# Altium footprint library 共模电感.PcbLib: 8 footprints
Each footprint in its own frame and in the unit in brackets; x right, y up, seen from the top. Pads: shape width x height; smd on the part's side, far side on the other; paste and mask are expansions set on the pad; w line width, h text height; cw(c..) or ccw(c..) is an arc to the next point about the centre after c.
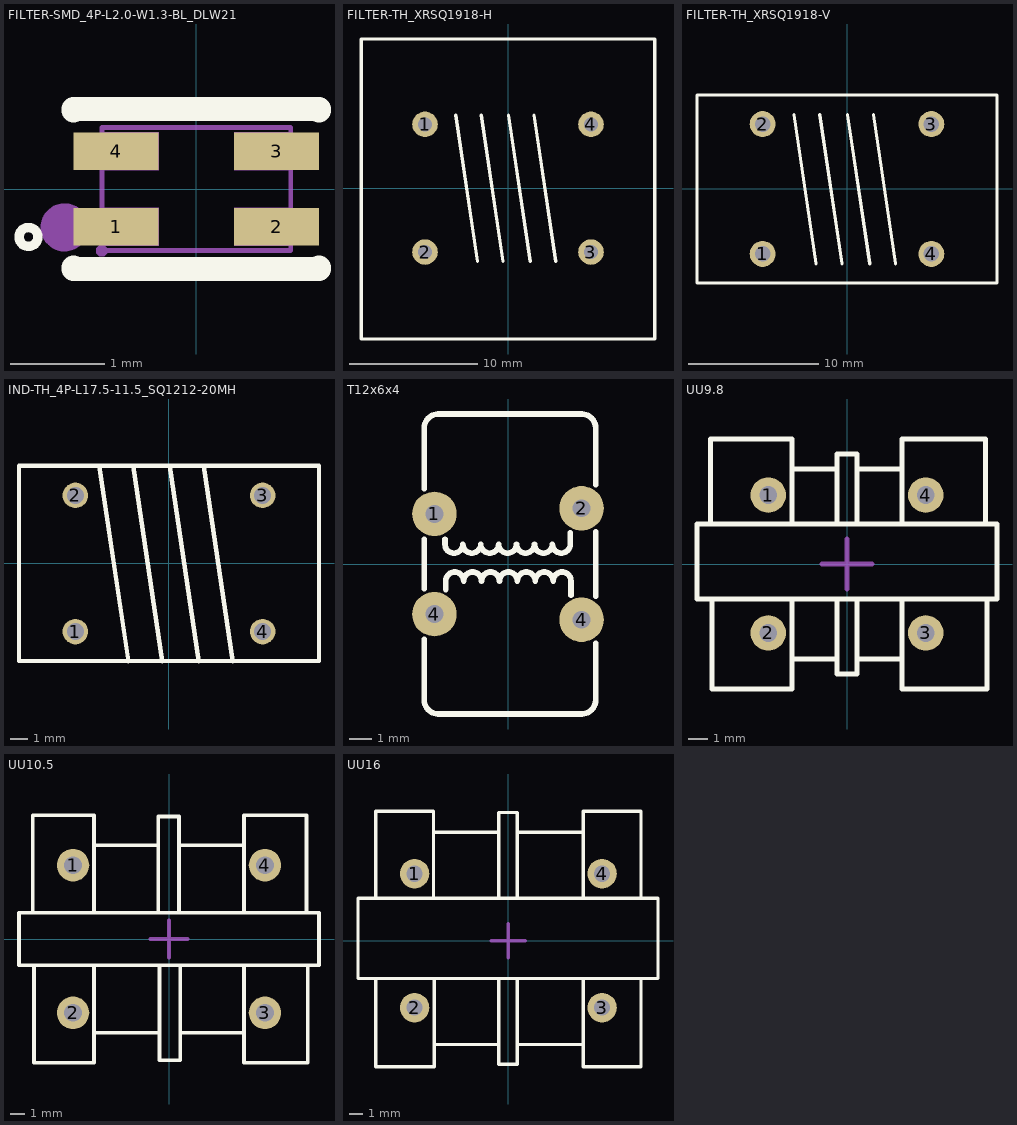
[diagram p0: the footprints below, top view; thin cyan lines are the x and y axes]

## FILTER-SMD_4P-L2.0-W1.3-BL_DLW21 [mm]
pads (4):
  rect 0.9x0.4 smd: 1(-0.85,-0.4) 2(0.85,-0.4) 3(0.85,0.4) 4(-0.85,0.4)
Top Overlay:
  circle w0.1: c-1.778,-0.508 r0.1
  lines w0.254: -1.3,-0.831 -1.3,-0.85 1.3,-0.85 1.3,-0.831 ; -1.3,0.831 -1.3,0.85 1.3,0.85 1.3,0.831
Mechanical 6:
  circle w0.254: c-1.396,-0.407 r0.127
Mechanical 15:
  region: 1,0.6 1,0.2 0.4,0.2 0.4,0.6
  region: 1,-0.2 1,-0.6 0.4,-0.6 0.4,-0.2
  region: -0.4,-0.2 -0.4,-0.6 -1,-0.6 -1,-0.2
  region: -0.4,0.6 -0.4,0.2 -1,0.2 -1,0.6
  region: -1.002,-0.713 -0.977,-0.713 -0.942,-0.678 -0.942,-0.629 -0.977,-0.593 -1.002,-0.593 -1.027,-0.593 -1.062,-0.628 -1.062,-0.678 -1.027,-0.713
  lines w0.051: -1,-0.65 1,-0.65 1,0.65 -1,0.65 -1,-0.65
3D body "U2.step": height 1.2, standoff 0, extent -1.01,-0.6 1.01,0.6

## FILTER-TH_XRSQ1918-H [mm]
pads (4):
  round 2 hole 1.1: 1(-6.5,5) 2(-6.5,-5) 3(6.5,-5) 4(6.5,5)
Top Overlay:
  lines w0.254: -4.09,5.724 -2.385,-5.75 ; -2.094,5.724 -0.389,-5.75 ; 0.04,5.724 1.745,-5.75 ; 2.038,5.724 3.743,-5.75 ; -11.5,-11.811 -11.5,11.684 11.5,11.684 11.5,-11.811 -11.5,-11.811
3D body "U6.step": height 14.2, standoff -3.3, extent -11.5,-11.755 11.5,11.755

## FILTER-TH_XRSQ1918-V [mm]
pads (4):
  round 2 hole 1.2: 1(-6.5,-5) 2(-6.5,5) 3(6.5,5) 4(6.5,-5)
Top Overlay:
  lines w0.254: -4.09,5.724 -2.385,-5.75 ; -2.094,5.724 -0.389,-5.75 ; 0.04,5.724 1.745,-5.75 ; 2.038,5.724 3.743,-5.75 ; -11.557,-7.25 -11.557,7.25 11.557,7.25 11.557,-7.25 -11.557,-7.25
3D body "FT1.step": height 25.5, standoff -3.5, extent -11.505,-7.25 11.505,7.25

## IND-TH_4P-L17.5-11.5_SQ1212-20MH [mm]
pads (4):
  round 1.5 hole 1: 1(-5.5,-4) 2(-5.5,4) 3(5.5,4) 4(5.5,-4)
Top Overlay:
  lines w0.254: -4.09,5.724 -2.385,-5.75 ; -2.094,5.724 -0.389,-5.75 ; 0.04,5.724 1.745,-5.75 ; 2.038,5.724 3.743,-5.75 ; -8.81,-5.73 8.81,-5.73 8.81,5.75 -8.81,5.75 -8.81,-5.73
Mechanical 15:
  region: -8.69,-5.75 -8.69,-5.725 -8.725,-5.69 -8.775,-5.69 -8.81,-5.725 -8.81,-5.75 -8.81,-5.775 -8.775,-5.81 -8.725,-5.81 -8.69,-5.775 -8.69,-5.75
  region: -5.1,-4 -5.1,-3.92 -5.161,-3.773 -5.273,-3.661 -5.42,-3.6 -5.58,-3.6 -5.727,-3.661 -5.839,-3.773 -5.9,-3.92 -5.9,-4 -5.9,-4.08 -5.839,-4.227 -5.727,-4.339 -5.58,-4.4 -5.42,-4.4 -5.273,-4.339 -5.161,-4.227 -5.1,-4.08 -5.1,-4
  region: -5.1,4 -5.1,4.08 -5.161,4.227 -5.273,4.339 -5.42,4.4 -5.58,4.4 -5.727,4.339 -5.839,4.227 -5.9,4.08 -5.9,4 -5.9,3.92 -5.839,3.773 -5.727,3.661 -5.58,3.6 -5.42,3.6 -5.273,3.661 -5.161,3.773 -5.1,3.92 -5.1,4
  region: 5.9,-4 5.9,-3.92 5.839,-3.773 5.727,-3.661 5.58,-3.6 5.42,-3.6 5.273,-3.661 5.161,-3.773 5.1,-3.92 5.1,-4 5.1,-4.08 5.161,-4.227 5.273,-4.339 5.42,-4.4 5.58,-4.4 5.727,-4.339 5.839,-4.227 5.9,-4.08 5.9,-4
  region: 5.9,4 5.9,4.08 5.839,4.227 5.727,4.339 5.58,4.4 5.42,4.4 5.273,4.339 5.161,4.227 5.1,4.08 5.1,4 5.1,3.92 5.161,3.773 5.273,3.661 5.42,3.6 5.58,3.6 5.727,3.661 5.839,3.773 5.9,3.92 5.9,4
  lines w0.051: -8.75,-5.75 8.75,-5.75 8.75,5.75 -8.75,5.75 -8.75,-5.75
3D body "L1.step": height 17, standoff -3.5, extent -8.75,-5.75 8.76,5.75

## T12x6x4 [mm] "直径：13.2mm，厚：7.2mm，脚距5*6.6mm"
pads (4):
  round 2 hole 0.8: 1(-3.3,2.25) 2(3.3,2.5) 4(-3.3,-2.25) 4(3.3,-2.5)
Top Overlay:
  lines w0.254: -3.759,-3.378 -3.759,-6.096 ccw(c-3.124,-6.096) -3.124,-6.731 3.175,-6.731 3.302,-6.731 ccw(c3.302,-6.096) 3.937,-6.096 3.937,-3.556 ; -3.759,-1.118 -3.759,0.584 -3.759,1.118 ; -3.759,3.378 -3.759,6.096 cw(c-3.124,6.096) -3.124,6.731 3.175,6.731 3.302,6.731 cw(c3.302,6.096) 3.937,6.096 3.937,3.556 ; -2.829,1.108 -2.829,0.889 ccw(c-2.427,0.889) -2.025,0.889 ccw(c-1.624,0.889) -1.222,0.889 ccw(c-0.82,0.889) -0.419,0.889 ccw(c-0.017,0.889) 0.384,0.889 ccw(c0.786,0.889) 1.188,0.889 ccw(c1.589,0.889) 1.991,0.889 ccw(c2.392,0.889) 2.794,0.889 2.794,1.397 ; -2.794,-1.143 -2.794,-0.762 cw(c-2.392,-0.762) -1.991,-0.762 cw(c-1.589,-0.762) -1.188,-0.762 cw(c-0.786,-0.762) -0.384,-0.762 cw(c0.017,-0.762) 0.419,-0.762 cw(c0.82,-0.762) 1.222,-0.762 cw(c1.624,-0.762) 2.025,-0.762 cw(c2.427,-0.762) 2.829,-0.762 2.829,-1.397 ; 3.937,-1.448 3.937,0.914 3.937,1.448
3D body "T12x6x4.STEP": height 12, standoff -3.53, extent -3.61,-6.604 3.789,6.604

## UU9.8 [mm] "17*12*17mm(长宽高）"
pads (4):
  round 1.8 hole 0.9: 1(-4,3.5) 2(-4,-3.5) 3(4,-3.5) 4(4,3.5)
Top Overlay:
  lines w0.254: -6.943,2.032 -6.943,6.35 -2.794,6.35 -2.794,2.032 ; -6.858,-1.778 -6.858,-6.35 -2.794,-6.35 -2.794,-1.778 ; -2.794,-4.826 -0.638,-4.826 ; -2.794,4.826 -0.508,4.826 ; -0.508,-1.778 -0.508,-5.588 0.508,-5.588 0.508,-1.778 ; -0.508,2.032 -0.508,5.588 0.508,5.588 0.508,2.032 ; 0.508,-4.826 2.794,-4.826 ; 0.508,4.826 2.794,4.826 ; 2.794,-1.778 2.794,-6.35 7.112,-6.35 7.112,-1.778 ; 2.794,2.032 2.794,6.35 7.027,6.35 7.027,2.032 ; -7.62,-1.778 -7.62,2.032 7.62,2.032 7.62,-1.778 -7.62,-1.778
Mechanical 15:
  lines w0.254: -1.27,0 1.27,0 ; 0,-1.27 0,1.27
3D body "UU9.8.STEP": height 17.05, standoff -3.45, extent -8.5,-6 8.5,6

## UU10.5 [mm] "18*16*20mm(长宽高）"
pads (4):
  round 2.2 hole 1.2: 1(-6.5,5) 2(-6.5,-5) 3(6.5,-5) 4(6.5,5)
Top Overlay:
  lines w0.254: -9.229,1.904 -9.229,8.382 -5.08,8.382 -5.08,1.904 ; -9.144,-1.81 -9.144,-8.382 -5.08,-8.382 -5.08,-1.81 ; -5.08,-6.35 -0.638,-6.35 ; -5.08,6.35 -0.723,6.35 ; -0.723,1.904 -0.723,8.304 0.677,8.304 0.677,1.904 ; -0.638,-1.81 -0.638,-8.21 0.762,-8.21 0.762,-1.81 ; 0.677,6.35 5.08,6.35 ; 0.762,-6.35 5.08,-6.35 ; 5.08,-1.904 5.08,-8.382 9.398,-8.382 9.398,-1.904 ; 5.08,1.904 5.08,8.382 9.313,8.382 9.313,1.904 ; -10.16,-1.778 10.16,-1.778 10.16,1.778 -10.16,1.778 -10.16,-1.778
Mechanical 15:
  lines w0.254: -1.27,0 1.27,0 ; 0,-1.27 0,1.27
3D body "UU10.5.STEP": height 21.05, standoff -3.45, extent -9.4,-8 9.4,8

## UU16 [mm] "22*17.5*23mm(长宽高）"
pads (4):
  round 2.2 hole 1.2: 1(-7,5) 2(-7,-5) 3(7,-5) 4(7,5)
Top Overlay:
  lines w0.254: -9.906,-2.826 -9.906,-9.398 -5.523,-9.398 -5.523,-2.826 ; -9.906,3.174 -9.906,9.652 -5.588,9.652 -5.588,3.174 ; -5.523,-7.749 -0.723,-7.749 ; -5.523,8.097 -0.723,8.097 ; -0.723,-2.826 -0.723,-9.226 0.677,-9.226 0.677,-2.826 ; -0.723,3.174 -0.723,9.574 0.677,9.574 0.677,3.174 ; 0.677,-7.749 5.477,-7.749 ; 0.677,8.097 5.477,8.097 ; 5.588,-2.92 5.588,-9.398 9.906,-9.398 9.906,-2.92 ; 5.588,3.174 5.588,9.652 9.906,9.652 9.906,3.174 ; -11.223,-2.826 11.177,-2.826 11.177,3.174 -11.223,3.174 -11.223,-2.826
Mechanical 15:
  lines w0.254: -1.27,0 1.27,0 ; 0,-1.27 0,1.27
3D body "UU16.STEP": height 22.05, standoff -3.45, extent -11,-8.75 11,8.75